# Altium footprint library Power_Lib_Altium.PcbLib: 383 footprints (part 14 of 24)
Each footprint in its own frame and in the unit in brackets; x right, y up, seen from the top. Pads: shape width x height; smd on the part's side, far side on the other; paste and mask are expansions set on the pad; w line width, h text height; cw(c..) or ccw(c..) is an arc to the next point about the centre after c.
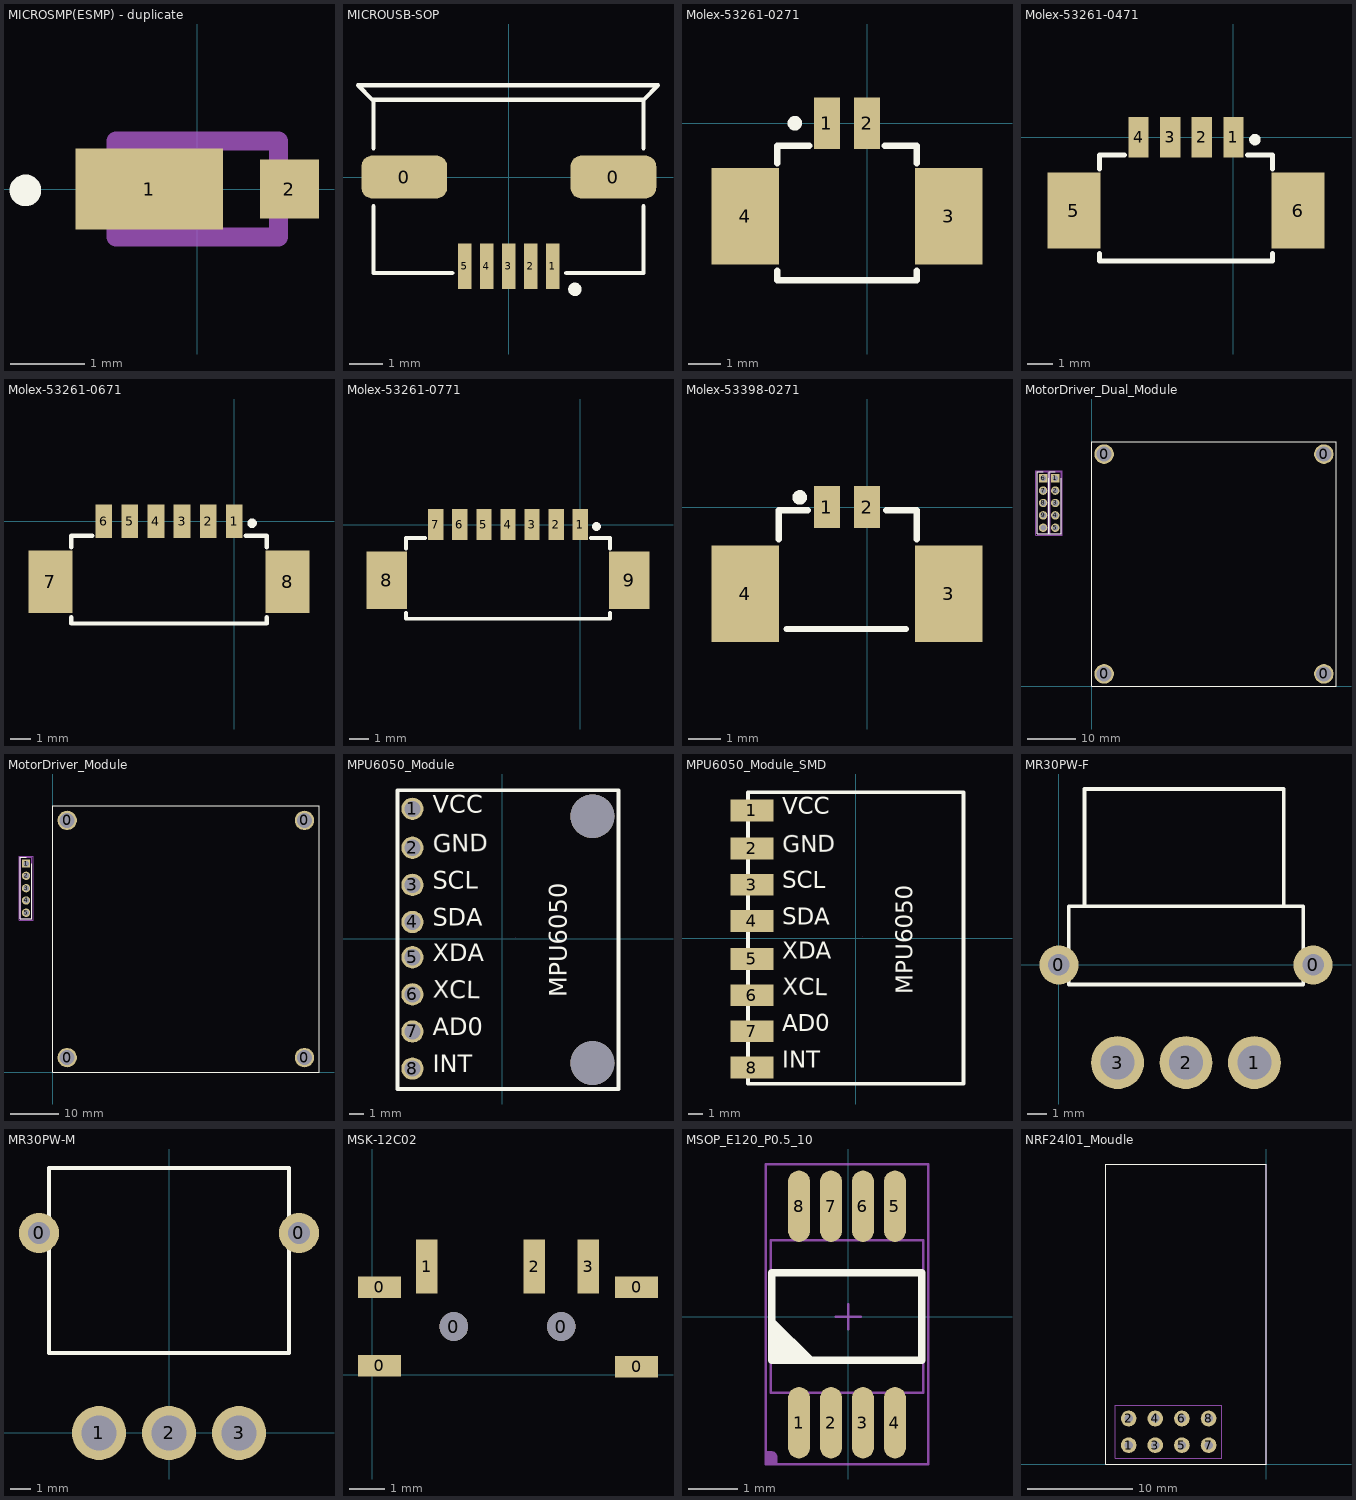
[diagram p13: the footprints below, top view; thin cyan lines are the x and y axes]

## MICROSMP(ESMP) - duplicate [mm]
pads (2):
  rect 2x1.1 smd: 1(-0.65,0)
  rect 0.8x0.8 smd: 2(1.25,0)
Top Overlay:
  circle w0.254: c-2.326,-0.019 r0.087
Mechanical 13:
  lines w0.254: -1.1,-0.65 -1.1,0.65 1.1,0.65 1.1,-0.65 -1.1,-0.65

## MICROUSB-SOP [mm]
pads (7):
  rrect50% 2.54x1.27 smd: 0(-3.099,0) 0(3.099,0)
  rect 0.4x1.35 smd: 1(1.3,-2.642) 2(0.65,-2.642) 3(0,-2.642) 4(-0.65,-2.642) 5(-1.3,-2.642)
Top Overlay:
  circle w0.2: c1.957,-3.327 r0.1
  lines w0.127: -4.013,-0.864 -4.013,-2.845 -1.676,-2.845 ; -4.013,0.851 -4.013,2.286 ; 1.702,-2.845 3.988,-2.845 3.988,-0.864 ; 3.988,0.851 3.988,2.286 ; 3.988,2.286 -4.039,2.286 -4.47,2.718 4.42,2.718 3.988,2.286

## Molex-53261-0271 [mm] "卧式1.25mm Pitch PicoBlade Header"
height 3.4
pads (4):
  rect 0.8x1.6 smd: 1(-1.25,0) 2(0,0)
  rect 2.1x3 smd: 3(2.55,-2.9) 4(-3.8,-2.9)
Top Overlay:
  circle w0.254: c-2.25,0 r0.1
  lines w0.2: -2.8,-4.6 -2.8,-4.9 1.55,-4.9 1.55,-4.6 ; -2.8,-1.25 -2.8,-0.7 -1.8,-0.7 ; 0.55,-0.7 1.55,-0.7 1.55,-1.25
3D body "MOLEX-53261-0271.stp": height 3.4, standoff 0, extent -4.46,-4.912 3.19,0.288

## Molex-53261-0471 [mm] "卧式1.25mm Pitch PicoBlade Header"
height 3.4
pads (6):
  rect 0.8x1.6 smd: 1(0,0) 2(-1.25,0) 3(-2.5,0) 4(-3.75,0)
  rect 2.1x3 smd: 5(-6.3,-2.9) 6(2.55,-2.9)
Top Overlay:
  circle w0.254: c0.85,-0.1 r0.1
  lines w0.2: -5.3,-4.6 -5.3,-4.9 1.55,-4.9 1.55,-4.6 ; -5.3,-1.25 -5.3,-0.7 -4.3,-0.7 ; 0.55,-0.7 1.55,-0.7 1.55,-1.25
3D body "MOLEX-53261-0471.stp": height 3.4, standoff 0, extent -6.975,-4.975 3.175,0.225

## Molex-53261-0671 [mm] "卧式1.25mm Pitch PicoBlade Header"
height 3.4
pads (8):
  rect 0.8x1.6 smd: 1(0,0) 2(-1.25,0) 3(-2.5,0) 4(-3.75,0) 5(-5,0) 6(-6.25,0)
  rect 2.1x3 smd: 7(-8.8,-2.9) 8(2.55,-2.9)
Top Overlay:
  circle w0.254: c0.85,-0.1 r0.1
  lines w0.2: -7.8,-4.6 -7.8,-4.9 1.55,-4.9 1.55,-4.6 ; -7.8,-1.25 -7.8,-0.7 -6.8,-0.7 ; 0.55,-0.7 1.55,-0.7 1.55,-1.25
3D body "MOLEX-53261-0671.stp": height 3.4, standoff 0, extent -9.449,-4.937 3.201,0.263

## Molex-53261-0771 [mm] "卧式1.25mm Pitch PicoBlade Header"
height 3.4
pads (9):
  rect 0.8x1.6 smd: 1(0,0) 2(-1.25,0) 3(-2.5,0) 4(-3.75,0) 5(-5,0) 6(-6.25,0) 7(-7.5,0)
  rect 2.1x3 smd: 8(-10.05,-2.9) 9(2.55,-2.9)
Top Overlay:
  circle w0.254: c0.85,-0.1 r0.1
  lines w0.2: -9.05,-4.6 -9.05,-4.9 1.55,-4.9 1.55,-4.6 ; -9.05,-1.25 -9.05,-0.7 -8.05,-0.7 ; 0.55,-0.7 1.55,-0.7 1.55,-1.25
3D body "MOLEX-53261-0771.stp": height 3.4, standoff 0, extent -10.7,-4.975 3.2,0.225

## Molex-53398-0271 [mm] "立式1.25mm Pitch PicoBlade Header"
height 3.4
pads (4):
  rect 0.8x1.3 smd: 1(-1.25,0) 2(0,0)
  rect 2.1x3 smd: 3(2.55,-2.7) 4(-3.8,-2.7)
Top Overlay:
  circle w0.254: c-2.1,0.3 r0.1
  lines w0.2: -2.75,-1 -2.75,-0.1 -1.85,-0.1 ; -2.5,-3.8 1.2,-3.8 ; 0.6,-0.1 1.55,-0.1 1.55,-1
3D body "MOLEX-53398-0271.stp": height 4.67, standoff -0.07, extent -4.425,-3.8 3.225,0.4

## MotorDriver_Dual_Module [mm] "https://item.taobao.com/item.htm?spm=a1z09.2.0.0.1d3d2e8dJ3GH0f&id=632838115364&_u=jm1j8an6841"
pads (14):
  round 4 hole 3.1: 0(2.5,2.5) 0(2.5,47.5) 0(47.5,2.5) 0(47.5,47.5)
  rect 1.725x1.725 hole 1.15: 1(-7.5,42.58) 6(-10,42.58)
  round 1.725 hole 1.15: 2(-7.5,40.04) 3(-7.5,37.5) 4(-7.5,34.96) 5(-7.5,32.42) 7(-10,40.04) 8(-10,37.5) 9(-10,34.96) 10(-10,32.42)
Top Overlay:
  lines w0.2: -10,43.85 -11.205,43.85 -11.205,31.15 -8.795,31.15 -8.795,42.58 ; -7.5,43.85 -8.705,43.85 -8.705,31.15 -6.295,31.15 -6.295,42.58
  lines w0.254: 0,0 50,0 50,50 0,50 0,0
Mechanical 13:
  lines w0.1: -11.205,31.15 -11.205,43.85 -8.795,43.85 -8.795,31.15 -11.205,31.15 ; -8.705,31.15 -8.705,43.85 -6.295,43.85 -6.295,31.15 -8.705,31.15
Mechanical 15:
  lines w0.05: -11.455,30.9 -11.455,44.1 -8.545,44.1 -8.545,30.9 -11.455,30.9 ; -8.955,30.9 -8.955,44.1 -6.045,44.1 -6.045,30.9 -8.955,30.9
3D body "10129378-905001BLF.stp": height 8.58, standoff -3.3, extent -11.205,31.15 -8.795,43.85
3D body "10129378-905001BLF.stp": height 8.58, standoff -3.3, extent -8.705,31.15 -6.295,43.85

## MotorDriver_Module [mm] "https://item.taobao.com/item.htm?spm=a1z09.2.0.0.1d3d2e8dJ3GH0f&id=632838115364&_u=jm1j8an6841"
pads (9):
  round 4 hole 3.1: 0(3,3) 0(3,52) 0(52,3) 0(52,52)
  rect 1.725x1.725 hole 1.15: 1(-5.5,43.08)
  round 1.725 hole 1.15: 2(-5.5,40.54) 3(-5.5,38) 4(-5.5,35.46) 5(-5.5,32.92)
Top Overlay:
  lines w0.2: -5.5,44.35 -6.705,44.35 -6.705,31.65 -4.295,31.65 -4.295,43.08
  lines w0.254: 0,0 55,0 55,55 0,55 0,0
Mechanical 13:
  lines w0.1: -6.795,31.65 -6.795,44.35 ; -6.705,31.65 -6.705,44.35 -4.295,44.35 -4.295,31.65 -6.705,31.65
Mechanical 15:
  lines w0.05: -6.545,31.4 -6.545,44.6 ; -6.955,31.4 -6.955,44.6 -4.045,44.6 -4.045,31.4 -6.955,31.4
3D body "10129378-905001BLF.stp": height 8.58, standoff -3.3, extent -6.705,31.65 -4.295,44.35

## MPU6050_Module [mil]
pads (10):
  round 60 hole 43.31: 1(-242.5,350) 2(-242.5,245) 3(-242.5,145) 4(-242.5,45) 5(-242.5,-50) 6(-242.5,-150) 7(-242.5,-250) 8(-242.5,-350)
  round 118.11 hole 118.11 unplated: ""(242.5,-335) ""(242.5,330)
Top Overlay:
  lines w10: -282.5,-405 312.5,-405 312.5,400 -282.5,400 -282.5,-405
  text "VCC" at -187.56,323.36 h80
  text "GND" at -186.65,217.04 h80
  text "SCL" at -187.56,118.36 h80
  text "SDA" at -187.56,18.36 h80
  text "MPU6050" at 189.12,-157.36 h80
  text "XDA" at -187.52,-76.64 h80
  text "XCL" at -187.5,-175.45 h80
  text "AD0" at -187.6,-276.3 h80
  text "INT" at -187.56,-376.64 h80
Mechanical 15:
  lines w0.1: 34.99,2.49 35.01,2.51

## MPU6050_Module_SMD [mil]
pads (8):
  rect 118.11x60 smd: 1(-286.56,352.5) 2(-286.56,247.5) 3(-286.56,147.5) 4(-286.56,47.5) 5(-286.56,-57.5) 6(-286.56,-157.5) 7(-286.56,-257.5) 8(-286.56,-357.5)
Top Overlay:
  lines w10: -297.5,-402.5 297.5,-402.5 297.5,402.5 -297.5,402.5 -297.5,-402.5
  text "VCC" at -202.56,325.86 h80
  text "GND" at -201.65,219.54 h80
  text "SCL" at -202.56,120.86 h80
  text "SDA" at -202.56,20.86 h80
  text "MPU6050" at 174.12,-154.86 h80
  text "XDA" at -202.52,-74.14 h80
  text "XCL" at -202.5,-172.95 h80
  text "AD0" at -202.6,-273.8 h80
  text "INT" at -202.56,-374.14 h80
Mechanical 15:
  lines w0.1: 19.99,4.99 20.01,5.01
3D body: height 78.74, standoff 0, extent -296.5,-401.04 297.01,402.11

## MR30PW-F [mm]
pads (5):
  round 2 hole 1.1: 0(0,0) 0(13,0)
  round 2.7 hole 1.75: 1(10,-5) 2(6.5,-5) 3(3,-5)
Top Overlay:
  lines w0.2: 1.3,3 1.3,9 11.5,9 11.5,3 ; 0.5,-1 0.5,3 12.5,3 12.5,-1 0.5,-1
3D body "MR30PW-F 3D DRAWING.STEP": height 4.9, standoff -2.05, extent -1.15,-5.952 14.15,8.948

## MR30PW-M [mm]
pads (5):
  round 2 hole 1.1: 0(-6.5,10) 0(6.5,10)
  round 2.7 hole 1.75: 1(-3.5,0) 2(0,0) 3(3.5,0)
Top Overlay:
  lines w0.2: -6,4 -6,13.25 6,13.25 6,4 -6,4
3D body "MR30PW-M 3D DRAWING.STEP": height 4.9, standoff -2.05, extent -7.65,-0.85 7.65,13.1

## MSK-12C02 [mm]
pads (9):
  rect 1.2x0.6 smd: 0(0.2,0.25) 0(0.2,2.45) 0(7.375,0.225) 0(7.375,2.45)
  round 0.8 hole 0.8 unplated: 0(2.275,1.35) 0(5.275,1.35)
  rect 0.6x1.5 smd: 1(1.525,3.025) 2(4.525,3.025) 3(6.025,3.025)
3D body "MSK-12C02.STEP": height 1.18, standoff -0.48, extent -0.075,-1.45 7.625,3.55

## MSOP_E120_P0.5_10 [mm]
height 1.1
pads (8):
  oval 0.45x1.45 smd: 1(-1,-2.159) 2(-0.35,-2.159) 3(0.3,-2.159) 4(0.95,-2.159) 5(0.95,2.241) 6(0.3,2.241) 7(-0.35,2.241) 8(-1,2.241)
Top Overlay:
  region: -1.549,-0.889 -1.549,0 -0.66,-0.889
  lines w0.152: -1.549,-0.889 -1.549,0.889 1.499,0.889 1.499,-0.889 -1.549,-0.889
Mechanical 13:
  lines w0.051: -0.254,0 0.254,0 ; 0,-0.254 0,0.254 ; -1.575,-1.55 1.525,-1.55 1.525,1.55 -1.575,1.55 -1.575,-1.55
Mechanical 14:
  region: -1.7,-2.988 -1.7,-2.734 -1.573,-2.734 -1.548,-2.734 -1.501,-2.753 -1.465,-2.789 -1.446,-2.835 -1.446,-2.861 -1.446,-2.988
  lines w0.051: -1.676,-2.997 -1.676,3.099 1.626,3.099 1.626,-2.997 -1.676,-2.997
3D body "DGK0008A.stp": height 0.97, standoff 0, extent -1.524,-2.451 1.473,2.451

## NRF24l01_Moudle [mm]
height 4.3
pads (8):
  round 1.5 hole 0.813: 1(-13.12,1.8) 2(-13.12,4.34) 3(-10.58,1.8) 4(-10.58,4.34) 5(-8.04,1.8) 6(-8.04,4.34) 7(-5.5,1.8) 8(-5.5,4.34)
Top Overlay:
  lines w0.1: -15.3,0 -15.3,28.6 0,28.6 0,0 -15.3,0
Mechanical 13:
  lines w0.051: -14.39,0.53 -4.23,0.53 -4.23,5.61 -14.39,5.61 -14.39,0.53
Mechanical 14:
  lines w0.051: -14.39,0.53 -14.39,5.61 -4.23,5.61 -4.23,0.53 -14.39,0.53
  lines w0.1: -15.3,0 -15.3,28.6 0,28.6 0,0 -15.3,0